# Altium footprint library Inductors THD.PcbLib: 43 footprints (part 2 of 4)
Each footprint in its own frame and in the unit in brackets; x right, y up, seen from the top. Pads: shape width x height; smd on the part's side, far side on the other; paste and mask are expansions set on the pad; w line width, h text height; cw(c..) or ccw(c..) is an arc to the next point about the centre after c.
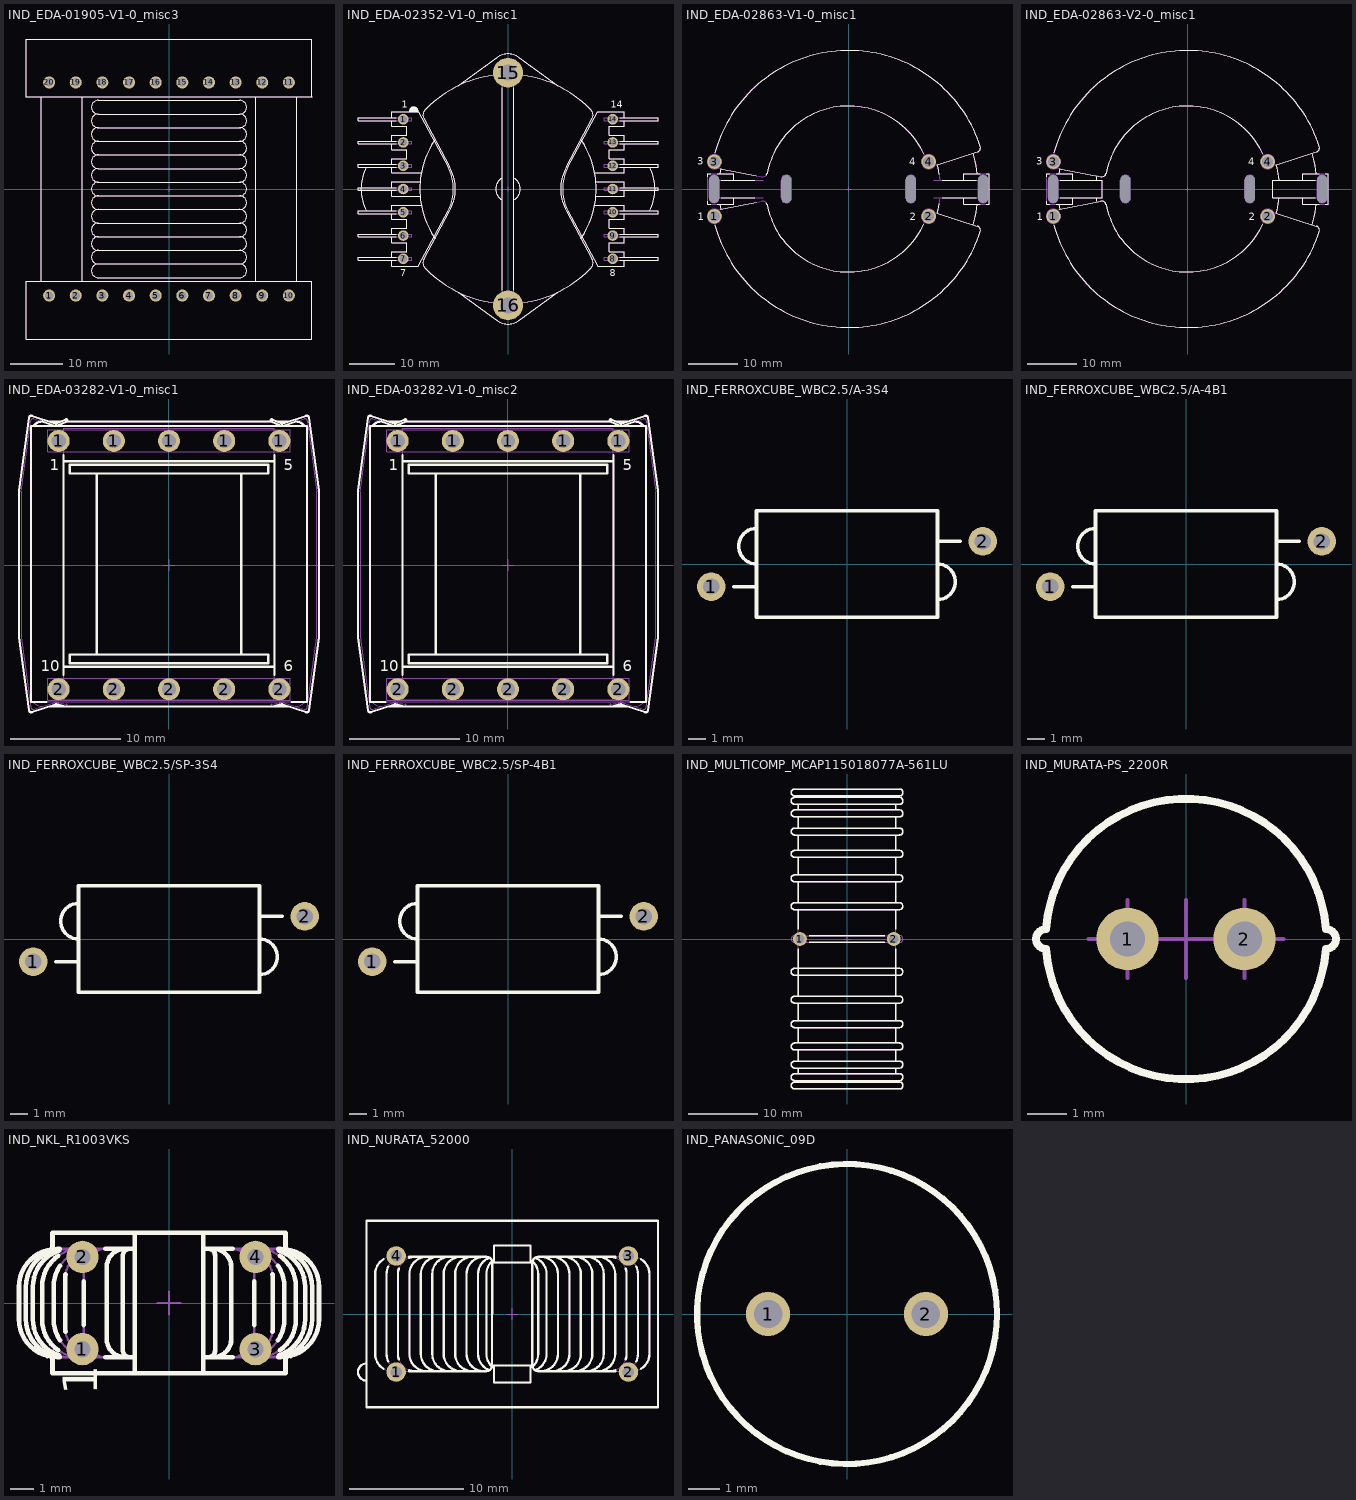
[diagram p1: the footprints below, top view; thin cyan lines are the x and y axes]

## IND_EDA-01905-V1-0_misc3 [mm] "see EDA-01905-V1-0_misc3"
height 40.6
pads (20):
  round 2.3 hole 1.6: 1(-22.86,-20.32) 2(-17.78,-20.32) 3(-12.7,-20.32) 4(-7.62,-20.32) 5(-2.54,-20.32) 6(2.54,-20.32) 7(7.62,-20.32) 8(12.7,-20.32) 9(17.78,-20.32) 10(22.86,-20.32) 11(22.86,20.32) 12(17.78,20.32) 13(12.7,20.32) 14(7.62,20.32) 15(2.54,20.32) 16(-2.54,20.32) 17(-7.62,20.32) 18(-12.7,20.32) 19(-17.78,20.32) 20(-22.86,20.32)
Top Overlay:
  lines w0.2: -27.35,17.6 27.35,17.6 ; -27.25,17.6 -27.25,28.6 27.25,28.6 27.25,17.6 ; -24.35,-17.6 -24.35,17.6 ; -16.583,-17.6 -16.583,17.6 ; 16.583,-17.6 16.583,17.6 ; 24.35,-17.6 24.35,17.6 ; -13.5,-14.3 cw(c-13.5,-13) -13.5,-11.7 ; -13.5,-14.3 ccw(c-13.5,-15.6) -13.5,-16.9 13.5,-16.9 ccw(c13.5,-15.6) 13.5,-14.3 ; -13.5,-14.3 13.5,-14.3 ; -13.5,-11.7 cw(c-13.5,-10.4) -13.5,-9.1 ; -13.5,-11.7 13.5,-11.7 ; -13.5,-9.1 cw(c-13.5,-7.8) -13.5,-6.5 ; -13.5,-9.1 13.5,-9.1 ; -13.5,-6.5 cw(c-13.5,-5.2) -13.5,-3.9 ; -13.5,-6.5 13.5,-6.5 ; -13.5,-3.9 cw(c-13.5,-2.6) -13.5,-1.3 ; -13.5,-3.9 13.5,-3.9 ; -13.5,-1.3 cw(c-13.5,0) -13.5,1.3 ; -13.5,-1.3 13.5,-1.3 ; -13.5,1.3 cw(c-13.5,2.6) -13.5,3.9 ; -13.5,1.3 13.5,1.3 ; -13.5,3.9 cw(c-13.5,5.2) -13.5,6.5 ; -13.5,3.9 13.5,3.9 ; -13.5,6.5 cw(c-13.5,7.8) -13.5,9.1 ; -13.5,6.5 13.5,6.5 ; -13.5,9.1 cw(c-13.5,10.4) -13.5,11.7 ; -13.5,9.1 13.5,9.1 ; -13.5,11.7 cw(c-13.5,13) -13.5,14.3 ; -13.5,11.7 13.5,11.7 ; -13.5,14.3 cw(c-13.5,15.6) -13.5,16.9 13.5,16.9 cw(c13.5,15.6) 13.5,14.3 ; -13.5,14.3 13.5,14.3 ; -13.5,14.3 13.5,14.3 ; 13.5,-14.3 ccw(c13.5,-13) 13.5,-11.7 ; 13.5,-11.7 ccw(c13.5,-10.4) 13.5,-9.1 ; 13.5,-9.1 ccw(c13.5,-7.8) 13.5,-6.5 ; 13.5,-6.5 ccw(c13.5,-5.2) 13.5,-3.9 ; 13.5,-3.9 ccw(c13.5,-2.6) 13.5,-1.3 ; 13.5,-1.3 ccw(c13.5,0) 13.5,1.3 ; 13.5,1.3 ccw(c13.5,2.6) 13.5,3.9 ; 13.5,3.9 ccw(c13.5,5.2) 13.5,6.5 ; 13.5,6.5 ccw(c13.5,7.8) 13.5,9.1 ; 13.5,9.1 ccw(c13.5,10.4) 13.5,11.7 ; 13.5,11.7 ccw(c13.5,13) 13.5,14.3 ; -27.25,-28.6 -27.25,-17.6 27.25,-17.6 27.25,-28.6 -27.25,-28.6
Mechanical 8:
  lines w0.1: -23.36,-20.32 -22.86,-20.32 ; -23.36,20.32 -22.86,20.32 ; -22.86,-20.82 -22.86,-20.32 ; -22.86,-19.82 -22.86,-20.32 ; -22.86,19.82 -22.86,20.32 ; -22.86,20.82 -22.86,20.32 ; -22.36,-20.32 -22.86,-20.32 ; -22.36,20.32 -22.86,20.32 ; -18.28,-20.32 -17.78,-20.32 ; -18.28,20.32 -17.78,20.32 ; -17.78,-20.82 -17.78,-20.32 ; -17.78,-19.82 -17.78,-20.32 ; -17.78,19.82 -17.78,20.32 ; -17.78,20.82 -17.78,20.32 ; -17.28,-20.32 -17.78,-20.32 ; -17.28,20.32 -17.78,20.32 ; -13.2,-20.32 -12.7,-20.32 ; -13.2,20.32 -12.7,20.32 ; -12.7,-20.82 -12.7,-20.32 ; -12.7,-19.82 -12.7,-20.32 ; -12.7,19.82 -12.7,20.32 ; -12.7,20.82 -12.7,20.32 ; -12.2,-20.32 -12.7,-20.32 ; -12.2,20.32 -12.7,20.32 ; -8.12,-20.32 -7.62,-20.32 ; -8.12,20.32 -7.62,20.32 ; -7.62,-20.82 -7.62,-20.32 ; -7.62,-19.82 -7.62,-20.32 ; -7.62,19.82 -7.62,20.32 ; -7.62,20.82 -7.62,20.32 ; -7.12,-20.32 -7.62,-20.32 ; -7.12,20.32 -7.62,20.32 ; -3.04,-20.32 -2.54,-20.32 ; -3.04,20.32 -2.54,20.32 ; -2.54,-20.82 -2.54,-20.32 ; -2.54,-19.82 -2.54,-20.32 ; -2.54,19.82 -2.54,20.32 ; -2.54,20.82 -2.54,20.32 ; -2.04,-20.32 -2.54,-20.32 ; -2.04,20.32 -2.54,20.32 ; -0.5,0 0,0 ; 0,-0.5 0,0 ; 0,0.5 0,0 ; 0.5,0 0,0 ; 2.04,-20.32 2.54,-20.32 ; 2.04,20.32 2.54,20.32 ; 2.54,-20.82 2.54,-20.32 ; 2.54,-19.82 2.54,-20.32 ; 2.54,19.82 2.54,20.32 ; 2.54,20.82 2.54,20.32 ; 3.04,-20.32 2.54,-20.32 ; 3.04,20.32 2.54,20.32 ; 7.12,-20.32 7.62,-20.32 ; 7.12,20.32 7.62,20.32 ; 7.62,-20.82 7.62,-20.32 ; 7.62,-19.82 7.62,-20.32 ; 7.62,19.82 7.62,20.32 ; 7.62,20.82 7.62,20.32 ; 8.12,-20.32 7.62,-20.32 ; 8.12,20.32 7.62,20.32 ; 12.2,-20.32 12.7,-20.32 ; 12.2,20.32 12.7,20.32 ; 12.7,-20.82 12.7,-20.32 ; 12.7,-19.82 12.7,-20.32 ; 12.7,19.82 12.7,20.32 ; 12.7,20.82 12.7,20.32 ; 13.2,-20.32 12.7,-20.32 ; 13.2,20.32 12.7,20.32 ; 17.28,-20.32 17.78,-20.32 ; 17.28,20.32 17.78,20.32 ; 17.78,-20.82 17.78,-20.32 ; 17.78,-19.82 17.78,-20.32 ; 17.78,19.82 17.78,20.32 ; 17.78,20.82 17.78,20.32 ; 18.28,-20.32 17.78,-20.32 ; 18.28,20.32 17.78,20.32 ; 22.36,-20.32 22.86,-20.32 ; 22.36,20.32 22.86,20.32 ; 22.86,-20.82 22.86,-20.32 ; 22.86,-19.82 22.86,-20.32 ; 22.86,19.82 22.86,20.32 ; 22.86,20.82 22.86,20.32 ; 23.36,-20.32 22.86,-20.32 ; 23.36,20.32 22.86,20.32
Mechanical 14:
  lines w0.1: -27.35,17.6 27.35,17.6 ; -27.25,17.6 -27.25,28.6 27.25,28.6 27.25,17.6 ; -24.35,-17.6 -24.35,17.6 ; -16.583,-17.6 -16.583,17.6 ; 16.583,-17.6 16.583,17.6 ; 24.35,-17.6 24.35,17.6 ; -13.5,-14.3 cw(c-13.5,-13) -13.5,-11.7 ; -13.5,-14.3 ccw(c-13.5,-15.6) -13.5,-16.9 13.5,-16.9 ccw(c13.5,-15.6) 13.5,-14.3 ; -13.5,-14.3 13.5,-14.3 ; -13.5,-11.7 cw(c-13.5,-10.4) -13.5,-9.1 ; -13.5,-11.7 13.5,-11.7 ; -13.5,-9.1 cw(c-13.5,-7.8) -13.5,-6.5 ; -13.5,-9.1 13.5,-9.1 ; -13.5,-6.5 cw(c-13.5,-5.2) -13.5,-3.9 ; -13.5,-6.5 13.5,-6.5 ; -13.5,-3.9 cw(c-13.5,-2.6) -13.5,-1.3 ; -13.5,-3.9 13.5,-3.9 ; -13.5,-1.3 cw(c-13.5,0) -13.5,1.3 ; -13.5,-1.3 13.5,-1.3 ; -13.5,1.3 cw(c-13.5,2.6) -13.5,3.9 ; -13.5,1.3 13.5,1.3 ; -13.5,3.9 cw(c-13.5,5.2) -13.5,6.5 ; -13.5,3.9 13.5,3.9 ; -13.5,6.5 cw(c-13.5,7.8) -13.5,9.1 ; -13.5,6.5 13.5,6.5 ; -13.5,9.1 cw(c-13.5,10.4) -13.5,11.7 ; -13.5,9.1 13.5,9.1 ; -13.5,11.7 cw(c-13.5,13) -13.5,14.3 ; -13.5,11.7 13.5,11.7 ; -13.5,14.3 cw(c-13.5,15.6) -13.5,16.9 13.5,16.9 cw(c13.5,15.6) 13.5,14.3 ; -13.5,14.3 13.5,14.3 ; -13.5,14.3 13.5,14.3 ; 13.5,-14.3 ccw(c13.5,-13) 13.5,-11.7 ; 13.5,-11.7 ccw(c13.5,-10.4) 13.5,-9.1 ; 13.5,-9.1 ccw(c13.5,-7.8) 13.5,-6.5 ; 13.5,-6.5 ccw(c13.5,-5.2) 13.5,-3.9 ; 13.5,-3.9 ccw(c13.5,-2.6) 13.5,-1.3 ; 13.5,-1.3 ccw(c13.5,0) 13.5,1.3 ; 13.5,1.3 ccw(c13.5,2.6) 13.5,3.9 ; 13.5,3.9 ccw(c13.5,5.2) 13.5,6.5 ; 13.5,6.5 ccw(c13.5,7.8) 13.5,9.1 ; 13.5,9.1 ccw(c13.5,10.4) 13.5,11.7 ; 13.5,11.7 ccw(c13.5,13) 13.5,14.3 ; -27.25,-28.6 -27.25,-17.6 27.25,-17.6 27.25,-28.6 -27.25,-28.6
3D body "IND_EDA-01905-V1-0_misc3.stp": height 43.4, standoff -3.86, extent -27.35,-28.6 27.35,28.6

## IND_EDA-02352-V1-0_misc1 [mm] "see EDA-02352-V1-0_misc1"
height 44.5
pads (16):
  round 2.3 hole 1.6: 1(-22.86,15.24) 2(-22.86,10.16) 3(-22.86,5.08) 4(-22.86,0) 5(-22.86,-5.08) 6(-22.86,-10.16) 7(-22.86,-15.24) 8(22.86,-15.24) 9(22.86,-10.16) 10(22.86,-5.08) 11(22.86,0) 12(22.86,5.08) 13(22.86,10.16) 14(22.86,15.24)
  round 6.5 hole 3.5: 15(0,25.4) 16(0,-25.4)
Top Overlay:
  lines w0.2: -30.902,-4.772 cw(c-22,0) -30.902,4.772 ; -25.4,-15.54 -25.4,-16.9 -19.6,-16.9 -13.098,-4.772 ccw(c-22,0) -13.098,4.772 -19.6,16.9 ; -25.4,-14.94 -25.4,-13.7 -22.1,-13.7 -22.1,-11.7 -25.4,-11.7 -25.4,-10.46 ; -25.4,-9.86 -25.4,-8.62 -22.1,-8.62 -22.1,-6.62 -25.4,-6.62 -25.4,-5.38 ; -25.4,-4.78 -25.4,-3.54 -18.922,-3.54 ; -25.4,-0.3 -25.4,-1.54 -19.188,-1.54 ; -25.4,0.3 -25.4,1.54 -19.188,1.54 ; -25.4,4.78 -25.4,3.54 -18.922,3.54 ; -25.4,5.38 -25.4,6.62 -22.1,6.62 -22.1,8.62 -25.4,8.62 -25.4,9.86 ; -25.4,10.46 -25.4,11.7 -22.1,11.7 -22.1,13.7 -25.4,13.7 -25.4,14.94 ; -25.4,15.54 -25.4,16.9 -19.6,16.9 ; -24.381,-15.54 -32.75,-15.54 -32.75,-14.94 -24.381,-14.94 ; -24.381,-10.46 -32.75,-10.46 -32.75,-9.86 -24.381,-9.86 ; -24.381,-5.38 -32.75,-5.38 -32.75,-4.78 -24.381,-4.78 ; -24.381,-0.3 -32.75,-0.3 -32.75,0.3 -24.381,0.3 ; -24.381,4.78 -32.75,4.78 -32.75,5.38 -24.381,5.38 ; -24.381,9.86 -32.75,9.86 -32.75,10.46 -24.381,10.46 ; -24.381,14.94 -32.75,14.94 -32.75,15.54 -24.381,15.54 ; -21.6,16.9 cw(c-20.6,16.9) -19.6,16.9 ; -21.4,16.9 cw(c-20.6,16.9) -19.8,16.9 ; -21.2,16.9 cw(c-20.6,16.9) -20,16.9 ; -21,16.9 cw(c-20.6,16.9) -20.2,16.9 ; -20.8,16.9 cw(c-20.6,16.9) -20.4,16.9 ; -15.932,-10.804 cw(c0,0) -15.932,10.804 ; -10.896,-22.501 -2.423,-28.708 ccw(c0,-25.4) 2.423,-28.708 10.896,-22.501 ; -10.896,22.501 -2.423,28.708 cw(c0,25.4) 2.423,28.708 10.896,22.501 ; -3.491,-24.755 cw(c0,0) -18.178,-17.163 cw(c-17.087,-16.133) -18.409,-15.425 -12.698,-4.772 ccw(c-21.6,0) -12.698,4.772 -18.409,15.425 cw(c-17.087,16.133) -18.178,17.163 cw(c0,0) -3.491,24.755 ; -1.3,-22.097 -1.3,22.097 ; -1.3,-2.366 cw(c0,0) -1.3,2.366 ; 1.3,-22.097 1.3,22.097 ; 1.3,-2.366 ccw(c0,0) 1.3,2.366 ; 3.491,-24.755 ccw(c0,0) 18.178,-17.163 ccw(c17.087,-16.133) 18.409,-15.425 12.698,-4.772 cw(c21.6,0) 12.698,4.772 18.409,15.425 ccw(c17.087,16.133) 18.178,17.163 ccw(c0,0) 3.491,24.755 ; 15.932,-10.804 ccw(c0,0) 15.932,10.804 ; 18.922,-3.54 25.4,-3.54 25.4,-4.78 ; 18.922,3.54 25.4,3.54 25.4,4.78 ; 19.188,-1.54 25.4,-1.54 25.4,-0.3 ; 19.188,1.54 25.4,1.54 25.4,0.3 ; 24.381,-15.54 32.75,-15.54 32.75,-14.94 24.381,-14.94 ; 24.381,-10.46 32.75,-10.46 32.75,-9.86 24.381,-9.86 ; 24.381,-5.38 32.75,-5.38 32.75,-4.78 24.381,-4.78 ; 24.381,-0.3 32.75,-0.3 32.75,0.3 24.381,0.3 ; 24.381,4.78 32.75,4.78 32.75,5.38 24.381,5.38 ; 24.381,9.86 32.75,9.86 32.75,10.46 24.381,10.46 ; 24.381,14.94 32.75,14.94 32.75,15.54 24.381,15.54 ; 25.4,-15.54 25.4,-16.9 19.6,-16.9 13.098,-4.772 cw(c22,0) 13.098,4.772 19.6,16.9 25.4,16.9 25.4,15.54 ; 25.4,-14.94 25.4,-13.7 22.1,-13.7 22.1,-11.7 25.4,-11.7 25.4,-10.46 ; 25.4,-9.86 25.4,-8.62 22.1,-8.62 22.1,-6.62 25.4,-6.62 25.4,-5.38 ; 25.4,5.38 25.4,6.62 22.1,6.62 22.1,8.62 25.4,8.62 25.4,9.86 ; 25.4,10.46 25.4,11.7 22.1,11.7 22.1,13.7 25.4,13.7 25.4,14.94 ; 30.902,-4.772 ccw(c22,0) 30.902,4.772
  text "1" at -23.238,17.75 h1.5
  text "7" at -23.478,-19.09 h1.5
  text "8" at 22.242,-19.09 h1.5
  text "14" at 22.482,17.75 h1.5
Mechanical 8:
  lines w0.1: -23.36,-15.24 -22.86,-15.24 ; -23.36,-10.16 -22.86,-10.16 ; -23.36,-5.08 -22.86,-5.08 ; -23.36,0 -22.86,0 ; -23.36,5.08 -22.86,5.08 ; -23.36,10.16 -22.86,10.16 ; -23.36,15.24 -22.86,15.24 ; -22.86,-15.74 -22.86,-15.24 ; -22.86,-14.74 -22.86,-15.24 ; -22.86,-10.66 -22.86,-10.16 ; -22.86,-9.66 -22.86,-10.16 ; -22.86,-5.58 -22.86,-5.08 ; -22.86,-4.58 -22.86,-5.08 ; -22.86,-0.5 -22.86,0 ; -22.86,0.5 -22.86,0 ; -22.86,4.58 -22.86,5.08 ; -22.86,5.58 -22.86,5.08 ; -22.86,9.66 -22.86,10.16 ; -22.86,10.66 -22.86,10.16 ; -22.86,14.74 -22.86,15.24 ; -22.86,15.74 -22.86,15.24 ; -22.36,-15.24 -22.86,-15.24 ; -22.36,-10.16 -22.86,-10.16 ; -22.36,-5.08 -22.86,-5.08 ; -22.36,0 -22.86,0 ; -22.36,5.08 -22.86,5.08 ; -22.36,10.16 -22.86,10.16 ; -22.36,15.24 -22.86,15.24 ; -0.5,-25.4 0,-25.4 ; -0.5,0 0,0 ; 0,-25.9 0,-25.4 ; 0,-24.9 0,-25.4 ; 0,-0.5 0,0 ; 0,0.5 0,0 ; 0.5,-25.4 0,-25.4 ; 0.5,0 0,0 ; 0,25.4 0,24.9 0,25.4 ; 0,25.4 0.5,25.4 0,25.4 ; 0,25.4 0,25.9 0,25.4 ; 0,25.4 -0.5,25.4 0,25.4 ; 22.86,-15.24 22.86,-15.74 22.86,-15.24 ; 22.86,-15.24 22.36,-15.24 22.86,-15.24 ; 22.86,-15.24 22.86,-14.74 22.86,-15.24 ; 22.86,-15.24 23.36,-15.24 22.86,-15.24 ; 22.86,-10.16 22.86,-10.66 22.86,-10.16 ; 22.86,-10.16 22.36,-10.16 22.86,-10.16 ; 22.86,-10.16 22.86,-9.66 22.86,-10.16 ; 22.86,-10.16 23.36,-10.16 22.86,-10.16 ; 22.86,-5.08 22.86,-5.58 22.86,-5.08 ; 22.86,-5.08 22.36,-5.08 22.86,-5.08 ; 22.86,-5.08 22.86,-4.58 22.86,-5.08 ; 22.86,-5.08 23.36,-5.08 22.86,-5.08 ; 22.86,0 22.86,-0.5 22.86,0 ; 22.86,0 22.36,0 22.86,0 ; 22.86,0 22.86,0.5 22.86,0 ; 22.86,0 23.36,0 22.86,0 ; 22.86,5.08 22.86,4.58 22.86,5.08 ; 22.86,5.08 22.36,5.08 22.86,5.08 ; 22.86,5.08 22.86,5.58 22.86,5.08 ; 22.86,5.08 23.36,5.08 22.86,5.08 ; 22.86,10.16 22.86,9.66 22.86,10.16 ; 22.86,10.16 22.36,10.16 22.86,10.16 ; 22.86,10.16 22.86,10.66 22.86,10.16 ; 22.86,10.16 23.36,10.16 22.86,10.16 ; 22.86,15.24 22.86,14.74 22.86,15.24 ; 22.86,15.24 22.36,15.24 22.86,15.24 ; 22.86,15.24 22.86,15.74 22.86,15.24 ; 22.86,15.24 23.36,15.24 22.86,15.24
Mechanical 14:
  drawing of 159 lines, arcs and shapes, not listed
  text "1" at -23.238,17.75 h1.5
  text "7" at -23.478,-19.09 h1.5
  text "8" at 22.242,-19.09 h1.5
  text "14" at 22.482,17.75 h1.5
3D body "IND_EPCOS_PM 50-39_Part2.stp": height -1.8, standoff -5.3, extent -18.572,-29.467 18.572,29.467
3D body "IND_EPCOS_PM 50-39_Part1.stp": height 44.47, standoff -8.5, extent -32.75,-26.7 32.75,27.1

## IND_EDA-02863-V1-0_misc1 [mm] "see EDA-02863-V1-0_misc1"
height 49.2
pads (8):
  round 2.9 hole 2.2: 1(-27.083,-5.5) 2(16.154,-5.5) 3(-27.083,5.5) 4(16.154,5.5)
  oval 1x4.6 hole 2 slot 5.6 at 90 deg unplated mask+0.5: 5(-27.15,0) 5(-12.55,0) 5(12.55,0) 5(27.15,0)
Top Overlay:
  lines w0.2: -28.4,-2.43 -28.4,-3.05 -27.78,-3.05 ; -28.4,2.43 -28.4,3.05 -27.78,3.05 ; -26.967,-7.346 ccw(c0,0) 26.582,-8.637 ccw(c25.726,-8.359) 26.006,-7.503 17.886,-4.85 ; -26.967,7.346 cw(c0,0) 26.582,8.637 cw(c25.726,8.359) 26.003,7.503 17.898,4.884 ; -26.52,-3.05 -23.2,-3.05 -23.2,-1.8 ; -26.52,3.05 -23.2,3.05 -23.2,1.8 ; -25.972,-3.05 ccw(c0,0) -25.826,-4.103 ; -25.972,3.05 cw(c0,0) -25.826,4.105 ; -25.862,-4.11 -18.62,-2.703 ; -25.86,4.111 -18.61,2.715 ; -25.75,-1.8 -18.95,-1.8 ; -25.75,1.8 -18.95,1.8 ; -16.608,2.836 ccw(c-17.323,3.383) -16.439,3.211 cw(c0,0) 15.183,7.075 ; -16.603,-2.831 cw(c-17.326,-3.368) -16.442,-3.196 ccw(c0,0) 15.183,-7.075 ; 17.896,4.883 cw(c0,0) 18.31,2.976 ; 17.903,-4.856 ccw(c0,0) 18.31,-2.976 ; 18.95,-1.8 25.75,-1.8 ; 18.95,1.8 25.75,1.8 ; 23.2,-1.8 23.2,-3.05 26.52,-3.05 ; 23.2,1.8 23.2,3.05 26.52,3.05 ; 25.134,-7.219 ccw(c0,0) 25.972,-3.05 ; 25.133,7.221 cw(c0,0) 25.972,3.05 ; 27.78,-3.05 28.4,-3.05 28.4,3.05 27.78,3.05
  text "3" at -30.6,4.9 h1.5
  text "2" at 12.3,-6.3 h1.5
  text "1" at -30.4,-6.3 h1.5
  text "4" at 12.2,4.8 h1.5
Mechanical 8:
  circle w0.1: c16.154,-5.5 r1.45
  circle w0.1: c16.154,-5.5 r1.1
  circle w0.1: c-27.083,-5.5 r1.45
  circle w0.1: c-27.083,-5.5 r1.1
  circle w0.1: c16.154,5.5 r1.45
  circle w0.1: c16.154,5.5 r1.1
  circle w0.1: c-27.083,5.5 r1.45
  circle w0.1: c-27.083,5.5 r1.1
  lines w0.1: -27.65,-1.8 -27.15,-1.8 ; -27.65,0 -27.15,0 ; -27.65,1.8 -27.15,1.8 ; -27.583,-5.5 -27.083,-5.5 ; -27.583,5.5 -27.083,5.5 ; -27.15,-2.3 -27.15,-1.8 ; -27.15,-1.3 -27.15,-1.8 ; -27.15,-0.5 -27.15,0 ; -27.15,0.5 -27.15,0 ; -27.15,1.3 -27.15,1.8 ; -27.15,2.3 -27.15,1.8 ; -27.083,-6 -27.083,-5.5 ; -27.083,-5 -27.083,-5.5 ; -27.083,5 -27.083,5.5 ; -27.083,6 -27.083,5.5 ; -26.65,-1.8 -27.15,-1.8 ; -26.65,0 -27.15,0 ; -26.65,1.8 -27.15,1.8 ; -26.583,-5.5 -27.083,-5.5 ; -26.583,5.5 -27.083,5.5 ; -13.05,-1.8 -12.55,-1.8 ; -13.05,0 -12.55,0 ; -13.05,1.8 -12.55,1.8 ; -12.55,-2.3 -12.55,-1.8 ; -12.55,-1.3 -12.55,-1.8 ; -12.55,-0.5 -12.55,0 ; -12.55,0.5 -12.55,0 ; -12.55,1.3 -12.55,1.8 ; -12.55,2.3 -12.55,1.8 ; -12.05,-1.8 -12.55,-1.8 ; -12.05,0 -12.55,0 ; -12.05,1.8 -12.55,1.8 ; -0.5,0 0,0 ; 0,-0.5 0,0 ; 0,0.5 0,0 ; 0.5,0 0,0 ; 12.05,-1.8 12.55,-1.8 ; 12.05,0 12.55,0 ; 12.05,1.8 12.55,1.8 ; 12.55,-2.3 12.55,-1.8 ; 12.55,-1.3 12.55,-1.8 ; 12.55,-0.5 12.55,0 ; 12.55,0.5 12.55,0 ; 12.55,1.3 12.55,1.8 ; 12.55,2.3 12.55,1.8 ; 13.05,-1.8 12.55,-1.8 ; 13.05,0 12.55,0 ; 13.05,1.8 12.55,1.8 ; 15.654,-5.5 16.154,-5.5 ; 15.654,5.5 16.154,5.5 ; 16.154,-6 16.154,-5.5 ; 16.154,-5 16.154,-5.5 ; 16.154,5 16.154,5.5 ; 16.154,6 16.154,5.5 ; 16.654,-5.5 16.154,-5.5 ; 16.654,5.5 16.154,5.5 ; 26.65,-1.8 27.15,-1.8 ; 26.65,0 27.15,0 ; 26.65,1.8 27.15,1.8 ; 27.15,-2.3 27.15,-1.8 ; 27.15,-1.3 27.15,-1.8 ; 27.15,-0.5 27.15,0 ; 27.15,0.5 27.15,0 ; 27.15,1.3 27.15,1.8 ; 27.15,2.3 27.15,1.8 ; 27.65,-1.8 27.15,-1.8 ; 27.65,0 27.15,0 ; 27.65,1.8 27.15,1.8 ; -28.15,-1.8 ccw(c-27.15,-1.8) -26.15,-1.8 -26.15,1.8 ccw(c-27.15,1.8) -28.15,1.8 -28.15,-1.8 ; -13.55,-1.8 ccw(c-12.55,-1.8) -11.55,-1.8 -11.55,1.8 ccw(c-12.55,1.8) -13.55,1.8 -13.55,-1.8 ; 11.55,-1.8 ccw(c12.55,-1.8) 13.55,-1.8 13.55,1.8 ccw(c12.55,1.8) 11.55,1.8 11.55,-1.8 ; 26.15,-1.8 ccw(c27.15,-1.8) 28.15,-1.8 28.15,1.8 ccw(c27.15,1.8) 26.15,1.8 26.15,-1.8
Mechanical 14:
  lines w0.1: -25.972,-3.05 ccw(c0,0) -25.826,-4.103 ; -25.972,3.05 cw(c0,0) -25.826,4.105 ; -23.2,-1.8 -23.2,-3.05 -28.4,-3.05 -28.4,3.05 -23.2,3.05 -23.2,1.8 ; -17.2,-1.8 -27.3,-1.8 -27.3,1.8 -17.2,1.8 ; -13.462,-1.8 ccw(c5,0) -13.359,-2.652 ; -13.462,1.8 cw(c5,0) -13.357,2.666 ; -12.2,-1.8 -12.2,1.8 ; 12.2,-1.8 12.2,1.8 ; 17.2,-1.8 27.3,-1.8 27.3,1.8 17.2,1.8 ; 17.896,4.883 cw(c0,0) 18.462,1.8 ; 17.903,-4.856 ccw(c0,0) 18.462,-1.8 ; 23.2,-1.8 23.2,-3.05 28.4,-3.05 28.4,3.05 23.2,3.05 23.2,1.8 ; 25.134,-7.219 ccw(c0,0) 25.972,-3.05 ; 25.133,7.221 cw(c0,0) 25.972,3.05 ; -27.436,-5.333 cw(c-26.553,-5.161) -26.725,-4.278 -17.497,-2.484 cw(c-17.326,-3.368) -16.442,-3.196 ccw(c0,0) 15.935,-5.162 cw(c16.791,-5.44) 17.07,-4.584 26.006,-7.503 cw(c25.726,-8.359) 26.582,-8.637 cw(c0,0) -27.436,-5.333 ; -27.436,5.333 ccw(c-26.553,5.161) -26.723,4.278 -17.493,2.5 ccw(c-17.323,3.383) -16.439,3.211 cw(c0,0) 15.926,5.19 ccw(c16.781,5.469) 17.058,4.612 26.003,7.503 ccw(c25.726,8.359) 26.582,8.637 ccw(c0,0) -27.436,5.333
3D body "IND_EDA-02863-V1-0_misc1.stp": height 49.2, standoff -17.2, extent -28.4,-27.961 28.4,27.961

## IND_EDA-02863-V2-0_misc1 [mm] "see EDA-02863-V2-0_misc1"
height 49.2
pads (8):
  round 2.9 hole 2.2: 1(-27.083,-5.5) 2(16.154,-5.5) 3(-27.083,5.5) 4(16.154,5.5)
  oval 1x4.6 hole 2 slot 5.6 at 90 deg unplated mask+0.5: 5(-27.15,0) 5(-12.55,0) 5(12.55,0) 5(27.15,0)
Top Overlay:
  lines w0.2: -28.4,-2.43 -28.4,-3.05 -27.78,-3.05 ; -28.4,2.43 -28.4,3.05 -27.78,3.05 ; -26.967,-7.346 ccw(c0,0) 26.582,-8.637 ccw(c25.726,-8.359) 26.006,-7.503 17.886,-4.85 ; -26.967,7.346 cw(c0,0) 26.582,8.637 cw(c25.726,8.359) 26.003,7.503 17.898,4.884 ; -26.52,-3.05 -23.2,-3.05 -23.2,-1.8 ; -26.52,3.05 -23.2,3.05 -23.2,1.8 ; -25.972,-3.05 ccw(c0,0) -25.826,-4.103 ; -25.972,3.05 cw(c0,0) -25.826,4.105 ; -25.862,-4.11 -17.497,-2.484 cw(c-17.326,-3.368) -16.442,-3.196 ; -25.86,4.111 -17.493,2.5 ccw(c-17.323,3.383) -16.439,3.211 ; -25.75,-1.8 -17.2,-1.8 -17.2,1.8 -25.75,1.8 ; -18.462,-1.8 ccw(c0,0) -18.359,-2.652 ; -18.462,1.8 cw(c0,0) -18.357,2.666 ; -16.608,2.836 ccw(c-17.323,3.383) -16.439,3.211 ; -16.603,-2.831 cw(c-17.326,-3.368) -16.442,-3.196 ; 15.183,-7.075 cw(c0,0) -16.442,-3.196 ; 15.183,7.075 ccw(c0,0) -16.439,3.211 ; 17.896,4.883 cw(c0,0) 18.462,1.8 ; 17.903,-4.856 ccw(c0,0) 18.462,-1.8 ; 23.2,-1.8 23.2,-3.05 26.52,-3.05 ; 23.2,1.8 23.2,3.05 26.52,3.05 ; 25.134,-7.219 ccw(c0,0) 25.972,-3.05 ; 25.133,7.221 cw(c0,0) 25.972,3.05 ; 25.75,-1.8 17.2,-1.8 17.2,1.8 25.75,1.8 ; 27.78,-3.05 28.4,-3.05 28.4,3.05 27.78,3.05
  text "4" at 12.2,4.8 h1.5
  text "1" at -30.4,-6.3 h1.5
  text "2" at 12.3,-6.3 h1.5
  text "3" at -30.6,4.9 h1.5
Mechanical 8:
  circle w0.1: c-27.083,5.5 r1.1
  circle w0.1: c-27.083,5.5 r1.45
  circle w0.1: c16.154,5.5 r1.1
  circle w0.1: c16.154,5.5 r1.45
  circle w0.1: c-27.083,-5.5 r1.1
  circle w0.1: c-27.083,-5.5 r1.45
  circle w0.1: c16.154,-5.5 r1.1
  circle w0.1: c16.154,-5.5 r1.45
  lines w0.1: -27.65,-1.8 -27.15,-1.8 ; -27.65,0 -27.15,0 ; -27.65,1.8 -27.15,1.8 ; -27.583,-5.5 -27.083,-5.5 ; -27.583,5.5 -27.083,5.5 ; -27.15,-2.3 -27.15,-1.8 ; -27.15,-1.3 -27.15,-1.8 ; -27.15,-0.5 -27.15,0 ; -27.15,0.5 -27.15,0 ; -27.15,1.3 -27.15,1.8 ; -27.15,2.3 -27.15,1.8 ; -27.083,-6 -27.083,-5.5 ; -27.083,-5 -27.083,-5.5 ; -27.083,5 -27.083,5.5 ; -27.083,6 -27.083,5.5 ; -26.65,-1.8 -27.15,-1.8 ; -26.65,0 -27.15,0 ; -26.65,1.8 -27.15,1.8 ; -26.583,-5.5 -27.083,-5.5 ; -26.583,5.5 -27.083,5.5 ; -13.05,-1.8 -12.55,-1.8 ; -13.05,0 -12.55,0 ; -13.05,1.8 -12.55,1.8 ; -12.55,-2.3 -12.55,-1.8 ; -12.55,-1.3 -12.55,-1.8 ; -12.55,-0.5 -12.55,0 ; -12.55,0.5 -12.55,0 ; -12.55,1.3 -12.55,1.8 ; -12.55,2.3 -12.55,1.8 ; -12.05,-1.8 -12.55,-1.8 ; -12.05,0 -12.55,0 ; -12.05,1.8 -12.55,1.8 ; -0.5,0 0,0 ; 0,-0.5 0,0 ; 0,0.5 0,0 ; 0.5,0 0,0 ; 12.05,-1.8 12.55,-1.8 ; 12.05,0 12.55,0 ; 12.05,1.8 12.55,1.8 ; 12.55,-2.3 12.55,-1.8 ; 12.55,-1.3 12.55,-1.8 ; 12.55,-0.5 12.55,0 ; 12.55,0.5 12.55,0 ; 12.55,1.3 12.55,1.8 ; 12.55,2.3 12.55,1.8 ; 13.05,-1.8 12.55,-1.8 ; 13.05,0 12.55,0 ; 13.05,1.8 12.55,1.8 ; 15.654,-5.5 16.154,-5.5 ; 15.654,5.5 16.154,5.5 ; 16.154,-6 16.154,-5.5 ; 16.154,-5 16.154,-5.5 ; 16.154,5 16.154,5.5 ; 16.154,6 16.154,5.5 ; 16.654,-5.5 16.154,-5.5 ; 16.654,5.5 16.154,5.5 ; 26.65,-1.8 27.15,-1.8 ; 26.65,0 27.15,0 ; 26.65,1.8 27.15,1.8 ; 27.15,-2.3 27.15,-1.8 ; 27.15,-1.3 27.15,-1.8 ; 27.15,-0.5 27.15,0 ; 27.15,0.5 27.15,0 ; 27.15,1.3 27.15,1.8 ; 27.15,2.3 27.15,1.8 ; 27.65,-1.8 27.15,-1.8 ; 27.65,0 27.15,0 ; 27.65,1.8 27.15,1.8 ; -28.15,-1.8 ccw(c-27.15,-1.8) -26.15,-1.8 -26.15,1.8 ccw(c-27.15,1.8) -28.15,1.8 -28.15,-1.8 ; -13.55,-1.8 ccw(c-12.55,-1.8) -11.55,-1.8 -11.55,1.8 ccw(c-12.55,1.8) -13.55,1.8 -13.55,-1.8 ; 11.55,-1.8 ccw(c12.55,-1.8) 13.55,-1.8 13.55,1.8 ccw(c12.55,1.8) 11.55,1.8 11.55,-1.8 ; 26.15,-1.8 ccw(c27.15,-1.8) 28.15,-1.8 28.15,1.8 ccw(c27.15,1.8) 26.15,1.8 26.15,-1.8
Mechanical 14:
  lines w0.1: -25.972,-3.05 ccw(c0,0) -25.826,-4.103 ; -25.972,3.05 cw(c0,0) -25.826,4.105 ; -23.2,-1.8 -23.2,-3.05 -28.4,-3.05 -28.4,3.05 -23.2,3.05 -23.2,1.8 ; -18.462,-1.8 ccw(c0,0) -18.359,-2.652 ; -18.462,1.8 cw(c0,0) -18.357,2.666 ; 17.896,4.883 cw(c0,0) 18.462,1.8 ; 17.903,-4.856 ccw(c0,0) 18.462,-1.8 ; 23.2,-1.8 23.2,-3.05 28.4,-3.05 28.4,3.05 23.2,3.05 23.2,1.8 ; 25.134,-7.219 ccw(c0,0) 25.972,-3.05 ; 25.133,7.221 cw(c0,0) 25.972,3.05 ; -27.436,-5.333 ccw(c0,0) 26.582,-8.637 ccw(c25.726,-8.359) 26.006,-7.503 17.07,-4.584 ccw(c16.791,-5.44) 15.935,-5.162 cw(c0,0) -16.442,-3.196 ccw(c-17.326,-3.368) -17.497,-2.484 -26.725,-4.278 ccw(c-26.553,-5.161) -27.436,-5.333 ; -27.436,5.333 cw(c0,0) 26.582,8.637 cw(c25.726,8.359) 26.003,7.503 17.058,4.612 cw(c16.781,5.469) 15.926,5.19 ccw(c0,0) -16.439,3.211 cw(c-17.323,3.383) -17.493,2.5 -26.723,4.278 cw(c-26.553,5.161) -27.436,5.333 ; -27.3,-1.8 -17.2,-1.8 -17.2,1.8 -27.3,1.8 -27.3,-1.8 ; 17.2,-1.8 27.3,-1.8 27.3,1.8 17.2,1.8 17.2,-1.8
3D body "EDA-02863-V2-0_misc1.stp": height 49.2, standoff -17.2, extent -28.4,-27.961 28.4,27.961
